# Altium footprint library SMD_Connectors.PcbLib: 28 footprints (part 1 of 2)
Each footprint in its own frame and in the unit in brackets; x right, y up, seen from the top. Pads: shape width x height; smd on the part's side, far side on the other; paste and mask are expansions set on the pad; w line width, h text height; cw(c..) or ccw(c..) is an arc to the next point about the centre after c.
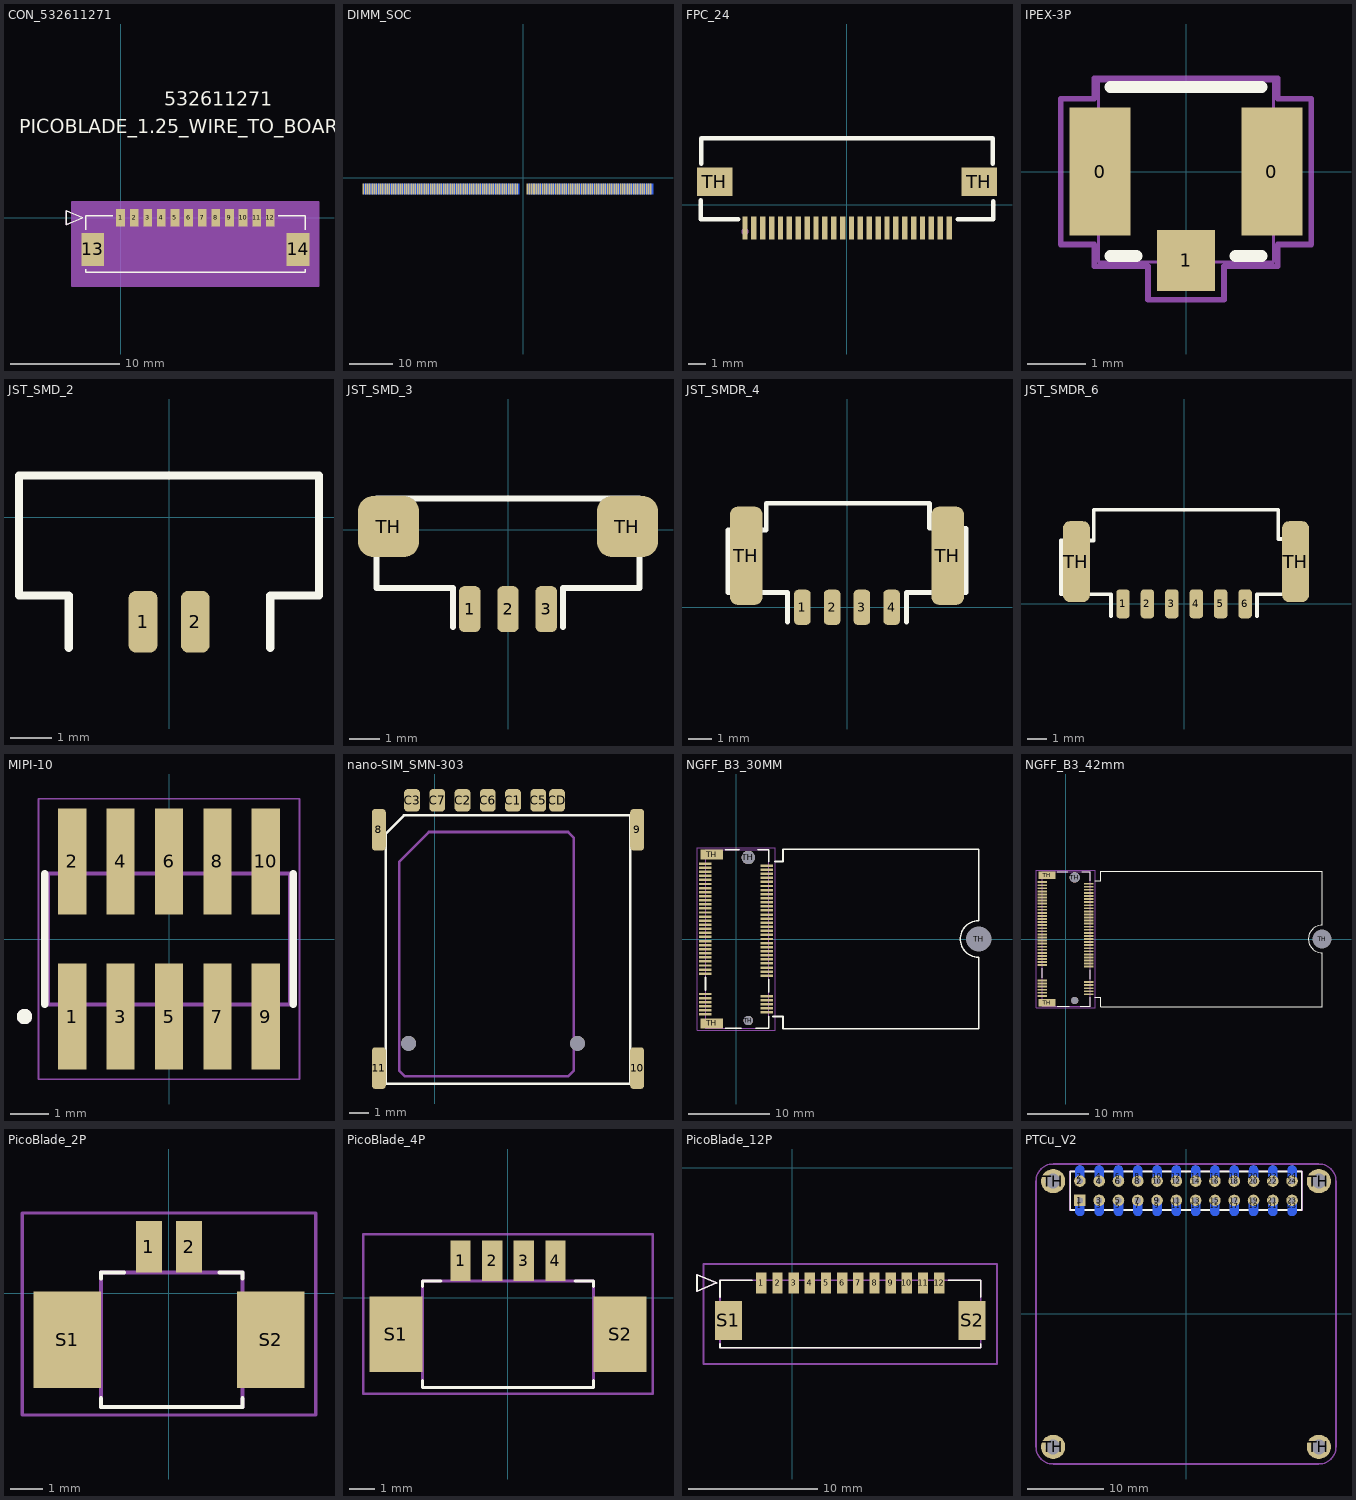
[diagram p0: the footprints below, top view; thin cyan lines are the x and y axes]

## CON_532611271 [mm]
pads (14):
  rect 0.8x1.6 smd paste+0 mask+0.076: 1(0,0) 2(1.25,0) 3(2.5,0) 4(3.75,0) 5(5,0) 6(6.25,0) 7(7.5,0) 8(8.75,0) 9(10,0) 10(11.25,0) 11(12.5,0) 12(13.75,0)
  rect 2.1x3 smd paste+0 mask+0.076: 13(-2.55,-2.9) 14(16.3,-2.9)
Top Overlay:
  lines w0.127: -3.2,-4.72 -3.2,-5 16.95,-5 16.95,-4.72 ; -3.2,-1.08 -3.2,0.2 -0.72,0.2 ; 14.47,0.2 16.95,0.2 16.95,-1.08 ; -4.978,-0.635 -4.978,0.635 -3.454,0 -4.978,-0.635
  text "532611271" at 4.018,10.3 h1.27
  text "PICOBLADE_1.25_WIRE_TO_BOARD_WAFER_ASSY_SMT_-12_CKT" at -9.317,7.76 h1.27
Top Courtyard:
  text "NOTE" at -3.2,-11.23 h1.27
  text "MAXIMUM_PACKAGE_HEIGHT:_3.4_MM" at -3.2,-13.77 h1.27
Mechanical 5:
  region: -3.581,0.581 17.331,0.581 17.331,-5.381 -3.581,-5.381
Mechanical 10:
  text "NOTE" at -3.2,-11.23 h1.27
  text "MAXIMUM_PACKAGE_HEIGHT:_3.4_MM" at -3.2,-13.77 h1.27
Top Assembly (Mech13):
  lines w0.127: -4.978,-0.635 -4.978,0.635 -3.454,0 -4.978,-0.635 ; -3.2,-5 16.95,-5 16.95,0.2 -3.2,0.2 -3.2,-5
  text "532611271" at 4.018,10.3 h1.27
  text "PICOBLADE_1.25_WIRE_TO_BOARD_WAFER_ASSY_SMT_-12_CKT" at -9.317,7.76 h1.27
Top Courtyard (Mech15):
  region: 18.22,1.47 -4.47,1.47 -4.47,-6.27 18.22,-6.27
  lines w0.127: -4.47,-6.27 -4.47,1.47 18.22,1.47 18.22,-6.27 -4.47,-6.27
3D body: height 0.25, standoff 0, extent 0,0 0.254,0.254

## DIMM_SOC [mm]
pads (260):
  rect 0.35x2.5 smd: 1(-36.875,-2.575) 3(-36.375,-2.575) 5(-35.875,-2.575) 7(-35.375,-2.575) 9(-34.875,-2.575) 11(-34.375,-2.575) 13(-33.875,-2.575) 15(-33.375,-2.575) 17(-32.875,-2.575) 19(-32.375,-2.575) 21(-31.875,-2.575) 23(-31.375,-2.575) 25(-30.875,-2.575) 27(-30.375,-2.575) 29(-29.875,-2.575) 31(-29.375,-2.575) 33(-28.875,-2.575) 35(-28.375,-2.575) 37(-27.875,-2.575) 39(-27.375,-2.575) 41(-26.875,-2.575) 43(-26.375,-2.575) 45(-25.875,-2.575) 47(-25.375,-2.575) 49(-24.875,-2.575) 51(-24.375,-2.575) 53(-23.875,-2.575) 55(-23.375,-2.575) 57(-22.875,-2.575) 59(-22.375,-2.575) 61(-21.875,-2.575) 63(-21.375,-2.575) 65(-20.875,-2.575) 67(-20.375,-2.575) 69(-19.875,-2.575) 71(-19.375,-2.575) 73(-18.875,-2.575) 75(-18.375,-2.575) 77(-17.875,-2.575) 79(-17.375,-2.575) 81(-16.875,-2.575) 83(-16.375,-2.575) 85(-15.875,-2.575) 87(-15.375,-2.575) 89(-14.875,-2.575) 91(-14.375,-2.575) 93(-13.875,-2.575) 95(-13.375,-2.575) 97(-12.875,-2.575) 99(-12.375,-2.575) 101(-11.875,-2.575) 103(-11.375,-2.575) 105(-10.875,-2.575) 107(-10.375,-2.575) 109(-9.875,-2.575) 111(-9.375,-2.575) 113(-8.875,-2.575) 115(-8.375,-2.575) 117(-7.875,-2.575) 119(-7.375,-2.575) 121(-6.875,-2.575) 123(-6.375,-2.575) 125(-5.875,-2.575) 127(-5.375,-2.575) 129(-4.875,-2.575) 131(-4.375,-2.575) 133(-3.875,-2.575) 135(-3.375,-2.575) 137(-2.875,-2.575) 139(-2.375,-2.575) 141(-1.875,-2.575) 143(-1.375,-2.575) 145(1,-2.575) 147(1.5,-2.575) 149(2,-2.575) 151(2.5,-2.575) 153(3,-2.575) 155(3.5,-2.575) 157(4,-2.575) 159(4.5,-2.575) 161(5,-2.575) 163(5.5,-2.575) 165(6,-2.575) 167(6.5,-2.575) 169(7,-2.575) 171(7.5,-2.575) 173(8,-2.575) 175(8.5,-2.575) 177(9,-2.575) 179(9.5,-2.575) 181(10,-2.575) 183(10.5,-2.575) 185(11,-2.575) 187(11.5,-2.575) 189(12,-2.575) 191(12.5,-2.575) 193(13,-2.575) 195(13.5,-2.575) 197(14,-2.575) 199(14.5,-2.575) 201(15,-2.575) 203(15.5,-2.575) 205(16,-2.575) 207(16.5,-2.575) 209(17,-2.575) 211(17.5,-2.575) 213(18,-2.575) 215(18.5,-2.575) 217(19,-2.575) 219(19.5,-2.575) 221(20,-2.575) 223(20.5,-2.575) 225(21,-2.575) 227(21.5,-2.575) 229(22,-2.575) 231(22.5,-2.575) 233(23,-2.575) 235(23.5,-2.575) 237(24,-2.575) 239(24.5,-2.575) 241(25,-2.575) 243(25.5,-2.575) 245(26,-2.575) 247(26.5,-2.575) 249(27,-2.575) 251(27.5,-2.575) 253(28,-2.575) 255(28.5,-2.575) 257(29,-2.575) 259(29.5,-2.575)
  rect 0.35x2.5 smd far side: 2(-36.625,-2.575) 4(-36.125,-2.575) 6(-35.625,-2.575) 8(-35.125,-2.575) 10(-34.625,-2.575) 12(-34.125,-2.575) 14(-33.625,-2.575) 16(-33.125,-2.575) 18(-32.625,-2.575) 20(-32.125,-2.575) 22(-31.625,-2.575) 24(-31.125,-2.575) 26(-30.625,-2.575) 28(-30.125,-2.575) 30(-29.625,-2.575) 32(-29.125,-2.575) 34(-28.625,-2.575) 36(-28.125,-2.575) 38(-27.625,-2.575) 40(-27.125,-2.575) 42(-26.625,-2.575) 44(-26.125,-2.575) 46(-25.625,-2.575) 48(-25.125,-2.575) 50(-24.625,-2.575) 52(-24.125,-2.575) 54(-23.625,-2.575) 56(-23.125,-2.575) 58(-22.625,-2.575) 60(-22.125,-2.575) 62(-21.625,-2.575) 64(-21.125,-2.575) 66(-20.625,-2.575) 68(-20.125,-2.575) 70(-19.625,-2.575) 72(-19.125,-2.575) 74(-18.625,-2.575) 76(-18.125,-2.575) 78(-17.625,-2.575) 80(-17.125,-2.575) 82(-16.625,-2.575) 84(-16.125,-2.575) 86(-15.625,-2.575) 88(-15.125,-2.575) 90(-14.625,-2.575) 92(-14.125,-2.575) 94(-13.625,-2.575) 96(-13.125,-2.575) 98(-12.625,-2.575) 100(-12.125,-2.575) 102(-11.625,-2.575) 104(-11.125,-2.575) 106(-10.625,-2.575) 108(-10.125,-2.575) 110(-9.625,-2.575) 112(-9.125,-2.575) 114(-8.625,-2.575) 116(-8.125,-2.575) 118(-7.625,-2.575) 120(-7.125,-2.575) 122(-6.625,-2.575) 124(-6.125,-2.575) 126(-5.625,-2.575) 128(-5.125,-2.575) 130(-4.625,-2.575) 132(-4.125,-2.575) 134(-3.625,-2.575) 136(-3.125,-2.575) 138(-2.625,-2.575) 140(-2.125,-2.575) 142(-1.625,-2.575) 144(-1.125,-2.575) 146(1.375,-2.575) 148(1.875,-2.575) 150(2.375,-2.575) 152(2.875,-2.575) 154(3.375,-2.575) 156(3.875,-2.575) 158(4.375,-2.575) 160(4.875,-2.575) 162(5.375,-2.575) 164(5.875,-2.575) 166(6.375,-2.575) 168(6.875,-2.575) 170(7.375,-2.575) 172(7.875,-2.575) 174(8.375,-2.575) 176(8.875,-2.575) 178(9.375,-2.575) 180(9.875,-2.575) 182(10.375,-2.575) 184(10.875,-2.575) 186(11.375,-2.575) 188(11.875,-2.575) 190(12.375,-2.575) 192(12.875,-2.575) 194(13.375,-2.575) 196(13.875,-2.575) 198(14.375,-2.575) 200(14.875,-2.575) 202(15.375,-2.575) 204(15.875,-2.575) 206(16.375,-2.575) 208(16.875,-2.575) 210(17.375,-2.575) 212(17.875,-2.575) 214(18.375,-2.575) 216(18.875,-2.575) 218(19.375,-2.575) 220(19.875,-2.575) 222(20.375,-2.575) 224(20.875,-2.575) 226(21.375,-2.575) 228(21.875,-2.575) 230(22.375,-2.575) 232(22.875,-2.575) 234(23.375,-2.575) 236(23.875,-2.575) 238(24.375,-2.575) 240(24.875,-2.575) 242(25.375,-2.575) 244(25.875,-2.575) 246(26.375,-2.575) 248(26.875,-2.575) 250(27.375,-2.575) 252(27.875,-2.575) 254(28.375,-2.575) 256(28.875,-2.575) 258(29.375,-2.575) 260(29.875,-2.575)

## FPC_24 [mm]
height 11.1
pads (26):
  rect 0.3x1.3 smd: 1(-5.748,-1.301) 2(-5.248,-1.301) 3(-4.748,-1.301) 4(-4.248,-1.301) 5(-3.748,-1.301) 6(-3.248,-1.301) 7(-2.748,-1.301) 8(-2.248,-1.301) 9(-1.748,-1.301) 10(-1.248,-1.301) 11(-0.748,-1.301) 12(-0.248,-1.301) 13(0.252,-1.301) 14(0.752,-1.301) 15(1.252,-1.301) 16(1.752,-1.301) 17(2.252,-1.301) 18(2.752,-1.301) 19(3.252,-1.301) 20(3.752,-1.301) 21(4.252,-1.301) 22(4.752,-1.301) 23(5.252,-1.301) 24(5.752,-1.301)
  rect 2x1.6 smd: TH(-7.45,1.301) TH(7.45,1.301)
Top Overlay:
  lines w0.254: -8.25,0.27 -8.25,-0.8 -6.129,-0.8 ; -8.199,2.332 -8.199,3.75 8.2,3.75 8.2,2.332 ; 6.25,-0.8 8.25,-0.8 8.25,0.2
Mechanical 1:
  circle w0.2: c-5.75,-1.5 r0.1
3D body "52437-2471.stp": height 2, standoff -0.04, extent -9.3,-1.45 9.3,3.75

## IPEX-3P [mm]
pads (3):
  rect 1.05x2.2 smd: 0(-1.475,0) 0(1.475,0)
  rect 1x1.05 smd: 1(0,-1.525)
Top Overlay:
  lines w0.2: -1.3,-1.45 -0.85,-1.45 ; -1.3,1.45 1.3,1.45 ; 0.85,-1.45 1.3,-1.45
Top Assembly (Mech13):
  lines w0.05: -1.5,-1.55 1.5,-1.55 1.5,1.55 -1.5,1.55 -1.5,-1.55
Top Courtyard (Mech15):
  lines w0.1: -1.575,1.6 -1.575,1.25 -2.15,1.25 -2.15,-1.25 -1.575,-1.25 -1.575,-1.625 -0.65,-1.625 -0.65,-2.2 0.65,-2.2 0.65,-1.625 1.575,-1.625 1.575,-1.25 2.15,-1.25 2.15,1.25 1.575,1.25 1.575,1.6 -1.55,1.6
3D body "User Library-IPEX.step": height 1.25, standoff -0.01, extent -1.5,-1.55 1.5,1.55

## JST_SMD_2 [mm]
pads (2):
  rrect50% 0.7x1.5 smd: 1(-0.635,-2.54) 2(0.635,-2.54)
Top Overlay:
  lines w0.2: -2.441,-3.175 -2.441,-1.905 -3.649,-1.905 -3.649,0 -3.649,1.013 3.643,1.013 3.643,0.834 3.643,-1.905 2.459,-1.905 2.459,-3.175
3D body "JST - GH - SMD (V) - 2Pin - 1.25mm.stp": height 4.66, standoff 0, extent -3.724,-3.162 3.724,1.079

## JST_SMD_3 [mm]
pads (5):
  rrect50% 0.7x1.5 smd: 1(-1.25,-2.6) 2(0,-2.6) 3(1.25,-2.6)
  rrect50% 2x2 smd: TH(-3.9,0.1) TH(3.9,0.1)
Top Overlay:
  lines w0.2: -1.8,-3.175 -1.8,-1.905 -4.3,-1.905 -4.3,-0.651 -4.3,1.013 3.643,1.013 4.3,1.013 4.3,-1.905 1.8,-1.905 1.8,-3.175
3D body "JST - GH - SMD (V) - 3Pin - 1.25mm.stp": height 4.66, standoff 0, extent -4.349,-3.292 4.349,0.95

## JST_SMDR_4 [mm]
pads (6):
  rrect50% 0.7x1.5 smd: 1(-1.905,0) 2(-0.635,0) 3(0.635,0) 4(1.905,0)
  rrect50% 1.4x4.2 smd: TH(-4.3,2.2) TH(4.3,2.2)
Top Overlay:
  lines w0.2: -2.54,-0.635 -2.54,0.635 -5.08,0.635 -5.08,3.295 -3.448,3.295 -3.448,4.445 3.517,4.445 3.517,3.374 5.08,3.374 5.08,0.635 2.54,0.635 2.54,-0.635
3D body "JST - GH - SMD (R) - 4Pin - 1.25mm.stp": height 3.53, standoff 0, extent -5.164,-0.445 5.164,4.902

## JST_SMDR_6 [mm]
pads (8):
  rrect50% 0.7x1.5 smd: 1(-3.175,0) 2(-1.905,0) 3(-0.635,0) 4(0.635,0) 5(1.905,0) 6(3.175,0)
  rrect50% 1.4x4.2 smd: TH(-5.6,2.2) TH(5.8,2.2)
Top Overlay:
  lines w0.2: -3.8,-0.635 -3.8,0.5 -6.4,0.5 -6.4,3.295 -4.7,3.295 -4.7,4.9 4.9,4.9 4.9,3.374 6.4,3.374 6.4,0.5 3.8,0.5 3.8,-0.635
3D body "JST - GH - SMD (R) - 6Pin - 1.25mm.stp": height 3.53, standoff 0, extent -6.414,-0.445 6.414,4.902

## MIPI-10 [mm]
pads (10):
  rect 0.74x2.79 smd: 1(-2.54,-2.035) 2(-2.54,2.035) 3(-1.27,-2.035) 4(-1.27,2.035) 5(0,-2.035) 6(0,2.035) 7(1.27,-2.035) 8(1.27,2.035) 9(2.54,-2.035) 10(2.54,2.035)
Top Overlay:
  circle w0.2: c-3.79,-2.035 r0.1
  lines w0.2: -3.26,-1.715 -3.26,1.715 ; 3.26,-1.715 3.26,1.715
Top Assembly (Mech13):
  circle w0.2: c-3.79,-2.035 r0.1
  lines w0.1: -3.175,-1.715 3.175,-1.715 3.175,1.715 -3.175,1.715 -3.175,-1.715
Top Courtyard (Mech15):
  lines w0.05: -3.425,-3.68 3.425,-3.68 3.425,3.68 -3.425,3.68 -3.425,-3.68
3D body "FTSH-105-01-L-DV-K.stp": height 6.01, standoff -0.11, extent -3.175,-2.921 3.175,2.921

## nano-SIM_SMN-303 [mm]
height 1.37
pads (19):
  rrect50% 0.7x2.1 smd: 8(-2.821,40.265) 9(10.179,40.265) 10(10.179,28.265) 11(-2.821,28.265)
  rrect50% 0.8x1.14 smd: C1(3.929,41.745) C2(1.389,41.745) C3(-1.151,41.745) C5(5.199,41.745) C6(2.659,41.745) C7(0.119,41.745) CD(6.149,41.745)
  round 0.75 hole 0.75 unplated: ""(-1.321,29.515) ""(7.179,29.515)
  rrect50% 1.2x3.8 on Top Overlay paste+0 mask+0: ""(0,30.3) ""(0,37.2) ""(2.525,30.3) ""(2.525,37.2) ""(5.075,30.3) ""(5.075,37.2)
Top Overlay:
  lines w0.127: -2.471,27.49 -2.471,40.074 -1.555,40.99 9.829,40.99 9.829,27.49 -2.471,27.49
Mechanical 1:
  lines w0.127: -1.8,28.15 -1.5,27.85 6.7,27.85 7,28.15 7,39.85 6.7,40.15 -0.3,40.15 -1.8,38.65 -1.8,28.15
3D body: height 1.37, standoff 0, extent -2.464,27.483 9.836,40.983

## NGFF_B3_30MM [mm]
pads (72):
  rect 1.55x0.3 smd: 1(-3.775,-9.25) 2(3.775,-9) 3(-3.775,-8.75) 4(3.775,-8.5) 5(-3.775,-8.25) 6(3.775,-8) 7(-3.775,-7.75) 8(3.775,-7.5) 9(-3.775,-7.25) 10(3.775,-7) 11(-3.775,-6.75) 20(3.775,-4.5) 21(-3.775,-4.25) 22(3.775,-4) 23(-3.775,-3.75) 24(3.775,-3.5) 25(-3.775,-3.25) 26(3.775,-3) 27(-3.775,-2.75) 28(3.775,-2.5) 29(-3.775,-2.25) 30(3.775,-2) 31(-3.775,-1.75) 32(3.775,-1.5) 33(-3.775,-1.25) 34(3.775,-1) 35(-3.775,-0.75) 36(3.775,-0.5) 37(-3.775,-0.25) 38(3.775,0) 39(-3.775,0.25) 40(3.775,0.5) 41(-3.775,0.75) 42(3.775,1) 43(-3.775,1.25) 44(3.775,1.5) 45(-3.775,1.75) 46(3.775,2) 47(-3.775,2.25) 48(3.775,2.5) 49(-3.775,2.75) 50(3.775,3) 51(-3.775,3.25) 52(3.775,3.5) 53(-3.775,3.75) 54(3.775,4) 55(-3.775,4.25) 56(3.775,4.5) 57(-3.775,4.75) 58(3.775,5) 59(-3.775,5.25) 60(3.775,5.5) 61(-3.775,5.75) 62(3.775,6) 63(-3.775,6.25) 64(3.775,6.5) 65(-3.775,6.75) 66(3.775,7) 67(-3.775,7.25) 68(3.775,7.5) 69(-3.775,7.75) 70(3.775,8) 71(-3.775,8.25) 72(3.775,8.5) 73(-3.775,8.75) 74(3.775,9) 75(-3.775,9.25)
  rect 2.75x1.2 smd: TH(-3,-10.35) TH(-3,10.35)
  round 1.15 hole 1.15 unplated: TH(1.5,-10)
  round 1.65 hole 1.65 unplated: TH(1.5,10)
  round 1.524 hole 3.1: TH(29.75,0)
Top Overlay:
  lines w0.2: -3.75,-6.28 -3.75,-4.72 ; -1.305,-10.95 0.605,-10.95 ; -1.305,10.95 0.355,10.95 ; 2.395,-10.95 4,-10.95 4,-9.47 ; 2.645,10.95 4,10.95 4,9.47 ; 4,-6.53 4,-4.97 ; 4.5,-9.5 5.75,-9.5 5.75,-11 29.75,-11 29.75,-2.25 cw(c29.75,0) 29.75,2.25 29.75,11 5.75,11 5.75,9.5 4.75,9.5
Top Assembly (Mech13):
  lines w0.127: -3.75,-10.95 4,-10.95 4,10.95 -3.75,10.95 -3.75,-10.95
Top Courtyard (Mech15):
  lines w0.05: -4.8,-11.2 4.8,-11.2 4.8,11.2 -4.8,11.2 -4.8,-11.2
3D body "c-2199230-3-b3-3d.stp": height 4.09, standoff -0.62, extent -4.35,-10.95 4.35,10.95
3D body "NGFF_B_Board_3omm.step": height 3.2, standoff 2.79, extent -0.25,-11 29.75,11

## NGFF_B3_42mm [mm]
pads (72):
  rect 1.55x0.3 smd: 1(-3.775,-9.25) 2(3.775,-9) 3(-3.775,-8.75) 4(3.775,-8.5) 5(-3.775,-8.25) 6(3.775,-8) 7(-3.775,-7.75) 8(3.775,-7.5) 9(-3.775,-7.25) 10(3.775,-7) 11(-3.775,-6.75) 20(3.775,-4.5) 21(-3.775,-4.25) 22(3.775,-4) 23(-3.775,-3.75) 24(3.775,-3.5) 25(-3.775,-3.25) 26(3.775,-3) 27(-3.775,-2.75) 28(3.775,-2.5) 29(-3.775,-2.25) 30(3.775,-2) 31(-3.775,-1.75) 32(3.775,-1.5) 33(-3.775,-1.25) 34(3.775,-1) 35(-3.775,-0.75) 36(3.775,-0.5) 37(-3.775,-0.25) 38(3.775,0) 39(-3.775,0.25) 40(3.775,0.5) 41(-3.775,0.75) 42(3.775,1) 43(-3.775,1.25) 44(3.775,1.5) 45(-3.775,1.75) 46(3.775,2) 47(-3.775,2.25) 48(3.775,2.5) 49(-3.775,2.75) 50(3.775,3) 51(-3.775,3.25) 52(3.775,3.5) 53(-3.775,3.75) 54(3.775,4) 55(-3.775,4.25) 56(3.775,4.5) 57(-3.775,4.75) 58(3.775,5) 59(-3.775,5.25) 60(3.775,5.5) 61(-3.775,5.75) 62(3.775,6) 63(-3.775,6.25) 64(3.775,6.5) 65(-3.775,6.75) 66(3.775,7) 67(-3.775,7.25) 68(3.775,7.5) 69(-3.775,7.75) 70(3.775,8) 71(-3.775,8.25) 72(3.775,8.5) 73(-3.775,8.75) 74(3.775,9) 75(-3.775,9.25)
  rect 2.75x1.2 smd: TH(-3,-10.35) TH(-3,10.35)
  round 1.15 hole 1.15 unplated: TH(1.5,-10)
  round 1.65 hole 1.65 unplated: TH(1.5,10)
  round 1.524 hole 3.1: TH(41.75,0)
Top Overlay:
  lines w0.2: -3.75,-6.28 -3.75,-4.72 ; -1.305,-10.95 0.605,-10.95 ; -1.305,10.95 0.355,10.95 ; 2.395,-10.95 4,-10.95 4,-9.47 ; 2.645,10.95 4,10.95 4,9.47 ; 4,-6.53 4,-4.97 ; 4.75,-9.5 5.75,-9.5 5.75,-11 41.75,-11 41.75,-2.25 cw(c41.75,0) 41.75,2.25 41.75,11 5.75,11 5.75,9.5 4.75,9.5
Top Assembly (Mech13):
  lines w0.127: -3.75,-10.95 4,-10.95 4,10.95 -3.75,10.95 -3.75,-10.95
Top Courtyard (Mech15):
  lines w0.05: -4.8,-11.2 4.8,-11.2 4.8,11.2 -4.8,11.2 -4.8,-11.2
3D body "c-2199230-3-b3-3d.stp": height 4.09, standoff -0.62, extent -4.35,-10.95 4.35,10.95
3D body "NGFF_B_Board.step": height 3, standoff 2.59, extent -0.25,-11 41.75,11

## PicoBlade_2P [mm]
pads (4):
  rect 0.8x1.6 smd: 1(-0.625,1.45) 2(0.625,1.45)
  rect 2.1x3 smd: S1(-3.175,-1.45) S2(3.175,-1.45)
Top Overlay:
  lines w0.127: -2.125,-3.275 -2.125,-3.55 2.286,-3.55 2.286,-3.275 ; -2.125,0.45 -2.125,0.65 -1.4,0.65 ; 1.569,0.65 2.294,0.65 2.294,0.45
Top Assembly (Mech13):
  lines w0.127: -2.125,-3.55 -2.125,0.65 2.286,0.65 2.286,-3.55 -2.125,-3.55
Top Courtyard (Mech15):
  lines w0.1: -4.572,-3.8 4.572,-3.8 4.572,2.5 -4.572,2.5 -4.572,-3.8
3D body "533980271.stp": height 4.77, standoff 0.08, extent -3.764,-2.496 3.886,1.704

## PicoBlade_4P [mm]
pads (6):
  rect 0.8x1.6 smd: 1(-1.875,1.45) 2(-0.625,1.45) 3(0.625,1.45) 4(1.875,1.45)
  rect 2.1x3 smd: S1(-4.425,-1.45) S2(4.425,-1.45)
Top Overlay:
  lines w0.127: -3.375,-3.275 -3.375,-3.55 3.375,-3.55 3.375,-3.275 ; -3.375,0.45 -3.375,0.65 -2.65,0.65 ; 2.65,0.65 3.375,0.65 3.375,0.45
Top Assembly (Mech13):
  lines w0.127: -3.375,-3.55 -3.375,0.65 3.375,0.65 3.375,-3.55 -3.375,-3.55
Top Courtyard (Mech15):
  lines w0.1: -5.725,-3.8 5.725,-3.8 5.725,2.5 -5.725,2.5 -5.725,-3.8
3D body "53398-0471.stp": height 4.77, standoff 0.03, extent -5.045,-2.461 5.105,1.739

## PicoBlade_12P [mm]
pads (14):
  rect 0.8x1.6 smd paste+0 mask+0.076: 1(-2.373,-8.917) 2(-1.123,-8.917) 3(0.127,-8.917) 4(1.377,-8.917) 5(2.627,-8.917) 6(3.877,-8.917) 7(5.127,-8.917) 8(6.377,-8.917) 9(7.627,-8.917) 10(8.877,-8.917) 11(10.127,-8.917) 12(11.377,-8.917)
  rect 2.1x3 smd paste+0 mask+0.076: S1(-4.923,-11.817) S2(13.927,-11.817)
Top Overlay:
  lines w0.127: -5.573,-13.637 -5.573,-13.917 14.577,-13.917 14.577,-13.637 ; -5.573,-9.997 -5.573,-8.717 -3.093,-8.717 ; 12.097,-8.717 14.577,-8.717 14.577,-9.997 ; -7.351,-9.552 -5.827,-8.917 -7.351,-8.282 -7.351,-9.552
Top Assembly (Mech13):
  lines w0.127: -7.351,-9.552 -5.827,-8.917 -7.351,-8.282 -7.351,-9.552 ; -5.573,-13.917 -5.573,-8.717 14.577,-8.717 14.577,-13.917 -5.573,-13.917
Top Courtyard (Mech15):
  lines w0.127: -6.843,-15.187 15.847,-15.187 15.847,-7.447 -6.843,-7.447 -6.843,-15.187
3D body: height 0.25, standoff 0, extent -2.373,-8.917 -2.119,-8.663
3D body "532611271.stp": height 3.4, standoff 0, extent -5.503,-13.675 14.647,-8.475

## PTCu_V2 [mm]
pads (52):
  oval 1.2x2.65 smd far side: 1(-13.97,14.23) 2(-13.97,18.23) 3(-11.43,14.23) 4(-11.43,18.23) 5(-8.89,14.23) 6(-8.89,18.23) 7(-6.35,14.23) 8(-6.35,18.23) 9(-3.81,14.23) 10(-3.81,18.23) 11(-1.27,14.23) 12(-1.27,18.23) 13(1.27,14.23) 14(1.27,18.23) 15(3.81,14.23) 16(3.81,18.23) 17(6.35,14.23) 18(6.35,18.23) 19(8.89,14.23) 20(8.89,18.23) 21(11.43,14.23) 22(11.43,18.23) 23(13.97,14.23) 24(13.97,18.23)
  rect 1.524x1.524 / inner rect 1.524x1.524 / far side rrect50% 1.2x1.2 hole 0.8: 1(-13.97,14.96)
  round 1.524 / inner round 1.524 / far side round 1.2 hole 0.8: 2(-13.97,17.5) 3(-11.43,14.96) 4(-11.43,17.5) 5(-8.89,14.96) 6(-8.89,17.5) 7(-6.35,14.96) 8(-6.35,17.5) 9(-3.81,14.96) 10(-3.81,17.5) 11(-1.27,14.96) 12(-1.27,17.5) 13(1.27,14.96) 14(1.27,17.5) 15(3.81,14.96) 16(3.81,17.5) 17(6.35,14.96) 18(6.35,17.5) 19(8.89,14.96) 20(8.89,17.5) 21(11.43,14.96) 22(11.43,17.5) 23(13.97,14.96) 24(13.97,17.5)
  round 3.2 hole 2: TH(-17.5,-17.5) TH(-17.5,17.5) TH(17.5,-17.5) TH(17.5,17.5)
Top Overlay:
  lines w0.254: -15.241,13.69 -15.241,18.77 -0.001,18.77 15.239,18.77 15.239,13.69 -0.001,13.69 -15.241,13.69
Bottom Overlay:
  lines w0.254: -15.24,13.69 -15.24,18.77 0,18.77 15.24,18.77 15.24,13.69 0,13.69 -15.24,13.69
Top Assembly (Mech13):
  lines w0.2: -0.046,13.661 15.25,13.661 15.25,18.803 -0.046,18.803 ; 0.01,13.661 -15.286,13.661 -15.286,18.803 0.01,18.803
Bottom Assembly:
  lines w0.2: -19.75,16.42 -19.75,17.5 cw(c-17.5,17.5) -17.5,19.75 17.5,19.75 cw(c17.5,17.5) 19.75,17.5 19.75,16.702 ; -19.75,16.51 -19.75,-17.5 ccw(c-17.5,-17.5) -17.5,-19.75 17.5,-19.75 ccw(c17.5,-17.5) 19.75,-17.5 19.75,16.764 ; 0,13.684 15.296,13.684 15.296,18.826 0,18.826 ; 0.056,13.684 -15.24,13.684 -15.24,18.826 0.056,18.826
Top Courtyard (Mech15):
  lines w0.2: -15.24,13.684 -15.24,18.826 15.296,18.826 15.296,13.684 -15.24,13.684
Bottom Courtyard:
  lines w0.15: -11.951,13.526 -11.951,13.679 ; -11.951,13.684 -13.45,13.684 -13.45,13.531 cw(c-13.97,13.531) -14.49,13.531 -14.49,13.684 -15.24,13.684 -15.24,18.826 -14.49,18.826 -14.49,18.979 cw(c-13.97,18.979) -13.45,18.979 -13.45,18.826 -11.951,18.826 ; -11.951,18.83 -11.951,18.984 ; -11.95,13.531 ccw(c-11.43,13.531) -10.91,13.531 -10.91,13.684 -9.411,13.684 ; -11.95,18.979 cw(c-11.43,18.979) -10.91,18.979 -10.91,18.826 -9.411,18.826 ; -9.411,13.526 -9.411,13.679 ; -9.411,18.83 -9.411,18.984 ; -9.41,13.531 ccw(c-8.89,13.531) -8.37,13.531 -8.37,13.684 -6.871,13.684 ; -9.41,18.979 cw(c-8.89,18.979) -8.37,18.979 -8.37,18.826 -6.871,18.826 ; -6.871,13.526 -6.871,13.679 ; -6.871,18.83 -6.871,18.984 ; -6.87,13.531 ccw(c-6.35,13.531) -5.83,13.531 -5.83,13.684 -4.331,13.684 ; -6.87,18.979 cw(c-6.35,18.979) -5.83,18.979 -5.83,18.826 -4.331,18.826 ; -4.331,13.526 -4.331,13.679 ; -4.331,18.83 -4.331,18.984 ; -4.33,13.531 ccw(c-3.81,13.531) -3.29,13.531 -3.29,13.684 -1.791,13.684 ; -4.33,18.979 cw(c-3.81,18.979) -3.29,18.979 -3.29,18.826 -1.791,18.826 ; -1.791,13.526 -1.791,13.679 ; -1.791,18.83 -1.791,18.984 ; -1.79,13.531 ccw(c-1.27,13.531) -0.75,13.531 -0.75,13.684 0.749,13.684 ; -1.79,18.979 cw(c-1.27,18.979) -0.75,18.979 -0.75,18.826 0.749,18.826 ; 0.749,13.526 0.749,13.679 ; 0.749,18.83 0.749,18.984 ; 0.75,13.531 ccw(c1.27,13.531) 1.79,13.531 1.79,13.684 3.289,13.684 ; 0.75,18.979 cw(c1.27,18.979) 1.79,18.979 1.79,18.826 3.289,18.826 ; 3.289,13.526 3.289,13.679 ; 3.289,18.83 3.289,18.984 ; 3.29,13.531 ccw(c3.81,13.531) 4.33,13.531 4.33,13.684 5.829,13.684 ; 3.29,18.979 cw(c3.81,18.979) 4.33,18.979 4.33,18.826 5.829,18.826 ; 5.829,13.526 5.829,13.679 ; 5.829,18.83 5.829,18.984 ; 5.83,13.531 ccw(c6.35,13.531) 6.87,13.531 6.87,13.684 8.369,13.684 ; 5.83,18.979 cw(c6.35,18.979) 6.87,18.979 6.87,18.826 8.369,18.826 ; 8.369,13.526 8.369,13.679 ; 8.369,18.83 8.369,18.984 ; 8.37,13.531 ccw(c8.89,13.531) 9.41,13.531 9.41,13.684 10.909,13.684 ; 8.37,18.979 cw(c8.89,18.979) 9.41,18.979 9.41,18.826 10.909,18.826 ; 10.909,13.526 10.909,13.679 ; 10.909,18.83 10.909,18.984 ; 10.91,13.531 ccw(c11.43,13.531) 11.95,13.531 11.95,13.684 13.449,13.684 ; 10.91,18.979 cw(c11.43,18.979) 11.95,18.979 11.95,18.826 13.449,18.826 ; 13.449,13.526 13.449,13.679 ; 13.449,18.83 13.449,18.984 ; 13.45,13.531 ccw(c13.97,13.531) 14.49,13.531 14.49,13.684 15.24,13.684 ; 13.45,18.979 cw(c13.97,18.979) 14.49,18.979 14.49,18.826 15.24,18.826 ; 15.296,13.684 15.296,18.826
3D body "PH3.5_PBD.stp": height 3.67, standoff 0.02, extent -15.24,12.93 15.24,19.53
3D body "PLS1.stp": height 8.54, standoff -3, extent 12.701,16.25 15.241,18.79
3D body "PLS1.stp": height 8.54, standoff -3, extent 10.161,16.25 12.701,18.79
3D body "PLS1.stp": height 8.54, standoff -3, extent -7.62,16.23 -5.08,18.77
3D body "PLS1.stp": height 8.54, standoff -3, extent -15.24,16.23 -12.7,18.77
3D body "PLS1.stp": height 8.54, standoff -3, extent -12.7,16.23 -10.16,18.77
3D body "PLS1.stp": height 8.54, standoff -3, extent -10.16,16.23 -7.62,18.77
3D body "PLS1.stp": height 8.54, standoff -3, extent -5.08,16.23 -2.54,18.77
3D body "PLS1.stp": height 8.54, standoff -3, extent -2.528,16.256 0.012,18.796
3D body "PLS1.stp": height 8.54, standoff -3, extent 0.012,16.269 2.552,18.809
3D body "PLS1.stp": height 8.54, standoff -3, extent 2.546,16.269 5.086,18.809
3D body "PLS1.stp": height 8.54, standoff -3, extent 5.083,16.25 7.623,18.79
3D body "PLS1.stp": height 8.54, standoff -3, extent 7.621,16.23 10.161,18.77
3D body "PLS1.stp": height 8.54, standoff -3, extent 12.701,13.71 15.241,16.25
3D body "PLS1.stp": height 8.54, standoff -3, extent 10.161,13.71 12.701,16.25
3D body "PLS1.stp": height 8.54, standoff -3, extent -7.62,13.69 -5.08,16.23
3D body "PLS1.stp": height 8.54, standoff -3, extent -15.24,13.69 -12.7,16.23
3D body "PLS1.stp": height 8.54, standoff -3, extent -12.7,13.69 -10.16,16.23
3D body "PLS1.stp": height 8.54, standoff -3, extent -10.16,13.69 -7.62,16.23
3D body "PLS1.stp": height 8.54, standoff -3, extent -5.08,13.69 -2.54,16.23
3D body "PLS1.stp": height 8.54, standoff -3, extent -2.528,13.716 0.012,16.256
3D body "PLS1.stp": height 8.54, standoff -3, extent 0.012,13.729 2.552,16.269
3D body "PLS1.stp": height 8.54, standoff -3, extent 2.546,13.729 5.086,16.269
3D body "PLS1.stp": height 8.54, standoff -3, extent 5.083,13.71 7.623,16.25
3D body "PLS1.stp": height 8.54, standoff -3, extent 7.621,13.69 10.161,16.23